# Altium footprint library UltraZOhm_CarrierBoard.PcbLib: 71 footprints (part 3 of 5)
Each footprint in its own frame and in the unit in brackets; x right, y up, seen from the top. Pads: shape width x height; smd on the part's side, far side on the other; paste and mask are expansions set on the pad; w line width, h text height; cw(c..) or ccw(c..) is an arc to the next point about the centre after c.
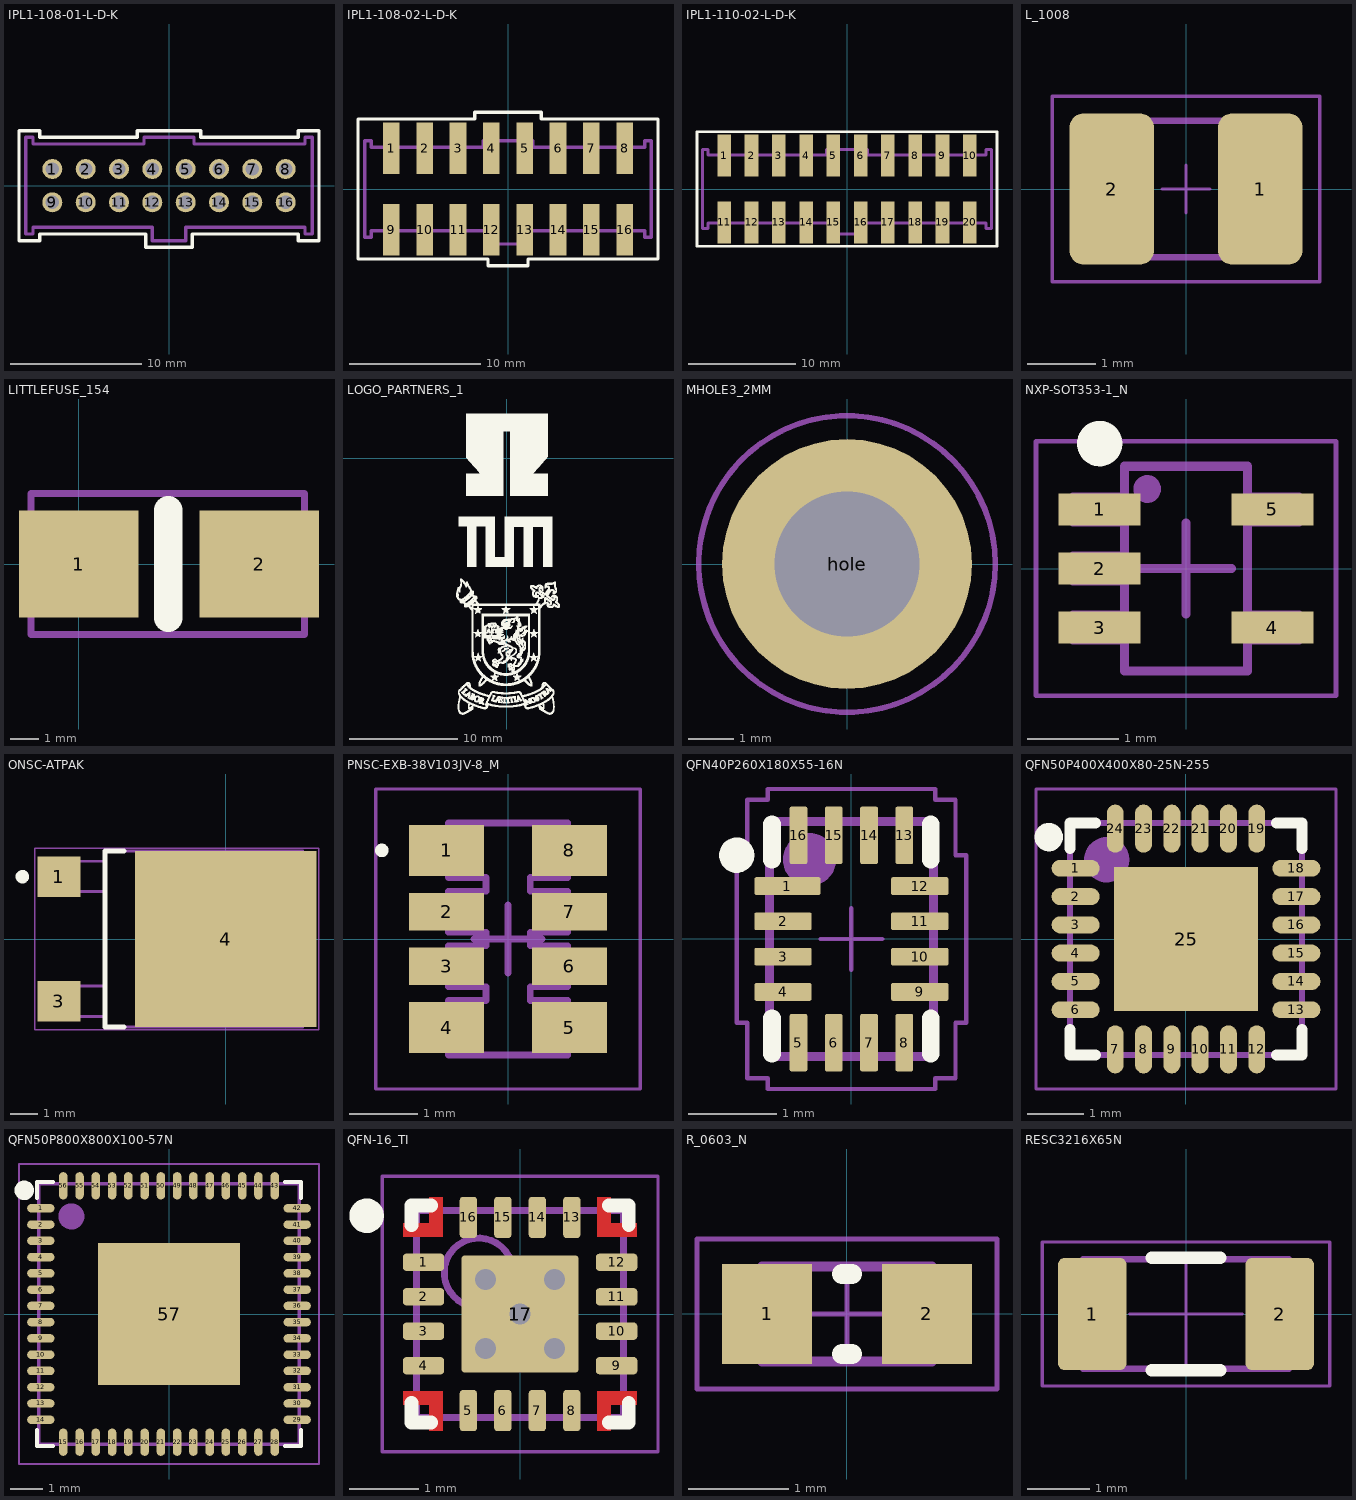
[diagram p2: the footprints below, top view; thin cyan lines are the x and y axes]

## IPL1-108-01-L-D-K [mil]
pads (16):
  round 60 hole 40 mask+3: 1(-350,50) 2(-250,50) 3(-150,50) 4(-50,50) 5(50,50) 6(150,50) 7(250,50) 8(350,50) 9(-350,-50) 10(-250,-50) 11(-150,-50) 12(-50,-50) 13(50,-50) 14(150,-50) 15(250,-50) 16(350,-50)
Top Overlay:
  lines w10: -450,-165 -388,-165 -388,-145 -70,-145 -70,-185 70,-185 70,-145 388,-145 388,-165 450,-165 450,165 388,165 388,145 95,145 95,165 -95,165 -95,145 -388,145 -388,165 -450,165 -450,-165
Mechanical 5:
  lines w10: -430,-145 -408,-145 -408,-125 -50,-125 -50,-165 50,-165 50,-125 408,-125 408,-145 430,-145 430,145 408,145 408,125 75,125 75,145 -75,145 -75,125 -408,125 -408,145 -430,145 -430,-145
  text ".Designator" at -29.95,74.14 h60
3D body "IPL1-108-01-L-D-K.stp": height 320, standoff -120, extent -430,-165 430,145

## IPL1-108-02-L-D-K [mil]
pads (16):
  rect 50x155 smd mask+2: 1(-350,122.5) 2(-250,122.5) 3(-150,122.5) 4(-50,122.5) 5(50,122.5) 6(150,122.5) 7(250,122.5) 8(350,122.5) 9(-350,-122.5) 10(-250,-122.5) 11(-150,-122.5) 12(-50,-122.5) 13(50,-122.5) 14(150,-122.5) 15(250,-122.5) 16(350,-122.5)
Top Overlay:
  lines w10: -450,-210 -60,-210 -60,-230 60,-230 60,-210 450,-210 450,210 100,210 100,230 -100,230 -100,210 -450,210 -450,-210
Mechanical 5:
  lines w10: -430,-145 -430,145 -410,145 -410,125 -75,125 -75,145 75,145 75,125 410,125 410,145 430,145 430,-145 410,-145 410,-125 50,-125 50,-165 -50,-165 -50,-125 -410,-125 -410,-145 -430,-145
  text ".Designator" at -33.94,63.07 h60
3D body "IPL1-108-02-L-D-K.stp": height 320, standoff -25, extent -430,-188.5 430,188.5

## IPL1-110-02-L-D-K [mil]
pads (20):
  rect 50x155 smd mask+2: 1(-450,122.5) 2(-350,122.5) 3(-250,122.5) 4(-150,122.5) 5(-50,122.5) 6(50,122.5) 7(150,122.5) 8(250,122.5) 9(350,122.5) 10(450,122.5) 11(-450,-122.5) 12(-350,-122.5) 13(-250,-122.5) 14(-150,-122.5) 15(-50,-122.5) 16(50,-122.5) 17(150,-122.5) 18(250,-122.5) 19(350,-122.5) 20(450,-122.5)
Top Overlay:
  lines w10: -550,-210 550,-210 550,210 -550,210 -550,-210
Mechanical 5:
  lines w10: -530,-145 -510,-145 -510,-125 -50,-125 -50,-165 50,-165 50,-125 510,-125 510,-145 530,-145 530,145 510,145 510,125 75,125 75,145 -75,145 -75,125 -510,125 -510,145 -530,145 -530,-145
  text ".Designator" at -59.06,-43.31 h60
3D body "IPL1-110-02-F-D-K.stp": height 345, standoff 0, extent -530,-188.5 530,188.5

## L_1008 [mm]
pads (2):
  rrect33% 1.24x2.22 smd: 1(1.09,0) 2(-1.09,0)
Mechanical 5:
  lines w0.1: -0.65,-1 -0.65,1 ; 0.65,-1 0.65,1 ; -1.25,-1 1.25,-1 1.25,1 -1.25,1 -1.25,-1
  text ".Designator" at 1.524,0.554 h0.76
Mechanical 15:
  lines w0.05: -0.35,0 0.35,0 ; 0,-0.35 0,0.35 ; -1.96,-1.36 1.96,-1.36 1.96,1.36 -1.96,1.36 -1.96,-1.36
3D body "LQM2HP_G0.stp": height 0.9, standoff 0, extent -1.25,-1 1.25,1

## LITTLEFUSE_154 [mm]
pads (2):
  rect 4.24x3.81 smd: 1(0,0) 2(6.4,0)
Top Overlay:
  lines w1: 3.175,-1.905 3.175,1.905
Mechanical 5:
  lines w0.254: -1.7,-2.5 8,-2.5 8,2.5 -1.7,2.5 -1.7,-2.5
  text ".Designator" at 4.116,0.832 h1.52
3D body "User Library-Littlefuse 0154 Holder and Fuse.STEP": height 3.71, standoff 0.01, extent -1.658,-2.488 8.042,2.512

## LOGO_PARTNERS_1 [mm]
Top Overlay:
  drawing of 11309 lines, arcs and shapes, not listed

## MHOLE3_2MM [mm]
pads (1):
  round 5.5 hole 3.2: hole(0,0)
Mechanical 5:
  circle w0.1: c0,0 r1.6
  circle w0.1: c0,0 r3.25
  text ".Designator" at -7.3,2.2 h1.52
Mechanical 14:
  circle w0.1: c0,0 r3.25
  circle w0.1: c0,0 r1.6
Mechanical 15:
  circle w0.05: c0,0 r3.3
  lines w0.05: -1,0 1,0 ; 0,-1 0,1
Mechanical 16:
  circle w0.05: c0,0 r3.3
3D body "SW3dPS-DIN 967.STEP": height 2.33, standoff -4, extent -3.75,-3.75 3.75,3.75

## NXP-SOT353-1_N [mm]
pads (5):
  rect 0.9x0.35 smd: 1(-0.95,0.65) 2(-0.95,0) 3(-0.95,-0.65) 4(0.95,-0.65) 5(0.95,0.65)
Top Overlay:
  circle w0.25: c-0.95,1.375 r0.125
Mechanical 5:
  circle w0.152: c-0.426,0.875 r0.076
  lines w0.05: -0.675,-0.813 -1.25,-0.813 -1.25,-0.488 -0.675,-0.488 ; -0.675,-0.163 -1.25,-0.163 -1.25,0.162 -0.675,0.162 ; -0.675,0.487 -1.25,0.487 -1.25,0.813 -0.675,0.813 ; 0.675,-0.813 1.25,-0.813 1.25,-0.487 0.675,-0.487 ; 0.675,0.488 1.25,0.488 1.25,0.813 0.675,0.813
  lines w0.1: -0.675,-1.125 0.675,-1.125 0.675,1.125 -0.675,1.125 -0.675,-1.125
  text ".Designator" at 0.273,1.317 h0.76
Mechanical 15:
  lines w0.05: -1.65,-1.4 1.65,-1.4 1.65,1.4 -1.65,1.4 -1.65,-1.4
  lines w0.1: -0.5,0 0.5,0 ; 0,-0.5 0,0.5
3D body: height 1.1, standoff 0, extent -0.675,-1.125 0.675,1.125

## ONSC-ATPAK [mm]
pads (3):
  rect 1.6x1.5 smd: 1(-6.15,2.3) 3(-6.15,-2.3)
  rect 6.7x6.5 smd: 4(0,0)
Top Overlay:
  circle w0.25: c-7.5,2.3 r0.125
  lines w0.2: -3.75,-3.25 -4.45,-3.25 -4.45,3.25 -3.75,3.25
Mechanical 5:
  lines w0.1: -4.5,-2.863 -6.45,-2.863 -6.45,-1.737 -4.475,-1.737 ; -4.475,1.75 -6.425,1.75 -6.425,2.875 -4.45,2.875 ; -4.45,-3.25 2.85,-3.25 2.85,3.25 -4.45,3.25 -4.45,-3.25
  text ".Designator" at -2.4,-0.7 h1.52
Mechanical 15:
  lines w0.05: -7.05,-3.35 -7.05,3.35 ; -7.05,-3.35 3.45,-3.35 ; -7.05,-3.35 -7.05,3.35 ; -7.05,-3.35 3.45,-3.35 ; -7.05,3.35 3.45,3.35 ; -7.05,3.35 3.45,3.35 ; 3.45,-3.35 3.45,3.35 ; 3.45,-3.35 3.45,3.35
  lines w0.1: -0.5,0 0.5,0 ; 0,-0.5 0,0.5
3D body: height 1.77, standoff 0.02, extent -4.45,-3.25 2.85,3.25

## PNSC-EXB-38V103JV-8_M [mm]
pads (8):
  rect 1.1x0.75 smd: 1(-0.9,1.3) 4(-0.9,-1.3) 5(0.9,-1.3) 8(0.9,1.3)
  rect 1.1x0.55 smd: 2(-0.9,0.4) 3(-0.9,-0.4) 6(0.9,-0.4) 7(0.9,0.4)
Top Overlay:
  circle w0.1: c-1.85,1.3 r0.05
Mechanical 5:
  lines w0.1: -0.875,-1.7 0.875,-1.7 0.875,-0.9 0.325,-0.9 0.325,-0.7 0.875,-0.7 0.875,-0.1 0.325,-0.1 0.325,0.1 0.875,0.1 0.875,0.7 0.325,0.7 0.325,0.9 0.875,0.9 0.875,1.7 -0.875,1.7 -0.875,0.9 -0.325,0.9 -0.325,0.7 -0.875,0.7 -0.875,0.1 -0.325,0.1 -0.325,-0.1 -0.875,-0.1 -0.875,-0.7 -0.325,-0.7 -0.325,-0.9 -0.875,-0.9 -0.875,-1.7
  text ".Designator" at 1.4,-2.004 h0.76
Mechanical 15:
  lines w0.05: -1.94,-2.2 -1.94,2.2 1.94,2.2 1.94,-2.2 -1.94,-2.2
  lines w0.1: -0.5,0 0.5,0 ; 0,-0.5 0,0.5
3D body: height 0.6, standoff 0, extent -0.875,-1.7 0.875,1.7

## QFN40P260X180X55-16N [mm]
pads (16):
  rrect20% 0.75x0.2 smd: 1(-0.725,0.6)
  rrect20% 0.65x0.2 smd: 2(-0.775,0.2) 3(-0.775,-0.2) 4(-0.775,-0.6) 9(0.775,-0.6) 10(0.775,-0.2) 11(0.775,0.2) 12(0.775,0.6)
  rrect20% 0.2x0.65 smd: 5(-0.6,-1.175) 6(-0.2,-1.175) 7(0.2,-1.175) 8(0.6,-1.175) 13(0.6,1.175) 14(0.2,1.175) 15(-0.2,1.175) 16(-0.6,1.175)
Top Overlay:
  circle w0.2: c-1.3,0.95 r0.1
  lines w0.2: -0.9,-1.3 -0.9,-0.9 ; -0.9,0.9 -0.9,1.3 ; 0.9,-1.3 0.9,-0.9 ; 0.9,0.9 0.9,1.3
Mechanical 5:
  circle w0.3: c-0.475,0.9 r0.15
  lines w0.1: -0.93,-1.33 0.93,-1.33 0.93,1.33 -0.93,1.33 -0.93,-1.33
  text ".Designator" at 0.655,-1.079 h0.76
Mechanical 12:
  lines w0.001: -0.9,-1.3 0.9,-1.3 0.9,1.3 -0.9,1.3 -0.9,-1.3
Mechanical 15:
  lines w0.05: -0.35,0 0.35,0 ; 0,-0.35 0,0.35 ; -1.3,-0.95 -1.18,-0.95 -1.18,-1.58 -0.95,-1.58 -0.95,-1.7 0.95,-1.7 0.95,-1.58 1.18,-1.58 1.18,-0.95 1.3,-0.95 1.3,0.95 1.18,0.95 1.18,1.58 0.95,1.58 0.95,1.7 -0.95,1.7 -0.95,1.58 -1.18,1.58 -1.18,0.95 -1.3,0.95 -1.3,-0.95
3D body: height 0.55, standoff 0.03, extent -0.93,-1.33 0.93,1.33
3D body: height 0.56, standoff 0, extent -0.798,0.601 -0.2,1.199

## QFN50P400X400X80-25N-255 [mm]
pads (25):
  oval 0.85x0.3 smd: 1(-1.95,1.25) 2(-1.95,0.75) 3(-1.95,0.25) 4(-1.95,-0.25) 5(-1.95,-0.75) 6(-1.95,-1.25) 13(1.95,-1.25) 14(1.95,-0.75) 15(1.95,-0.25) 16(1.95,0.25) 17(1.95,0.75) 18(1.95,1.25)
  oval 0.3x0.85 smd: 7(-1.25,-1.95) 8(-0.75,-1.95) 9(-0.25,-1.95) 10(0.25,-1.95) 11(0.75,-1.95) 12(1.25,-1.95) 19(1.25,1.95) 20(0.75,1.95) 21(0.25,1.95) 22(-0.25,1.95) 23(-0.75,1.95) 24(-1.25,1.95)
  rect 2.55x2.55 smd: 25(0,0)
Top Overlay:
  circle w0.25: c-2.425,1.8 r0.125
  lines w0.2: -2.05,-1.6 -2.05,-2.05 -1.6,-2.05 ; -2.05,1.6 -2.05,2.05 -1.6,2.05 ; 1.6,-2.05 2.05,-2.05 2.05,-1.6 ; 1.6,2.05 2.05,2.05 2.05,1.6
Mechanical 5:
  circle w0.4: c-1.4,1.4 r0.2
  lines w0.1: -2.05,-2.05 2.05,-2.05 2.05,2.05 -2.05,2.05 -2.05,-2.05
  text ".Designator" at 2.526,2.077 h1.52
Mechanical 15:
  lines w0.05: -0.5,0 0.5,0 ; 0,-0.5 0,0.5 ; -2.65,-2.65 2.65,-2.65 2.65,2.65 -2.65,2.65 -2.65,-2.65
3D body "User Library-QFN24-0_5.STEP": height 1, standoff 0, extent -2,-2 2,2

## QFN50P800X800X100-57N [mm]
pads (57):
  oval 0.84x0.26 smd: 1(-3.94,3.25) 2(-3.94,2.75) 3(-3.94,2.25) 4(-3.94,1.75) 5(-3.94,1.25) 6(-3.94,0.75) 7(-3.94,0.25) 8(-3.94,-0.25) 9(-3.94,-0.75) 10(-3.94,-1.25) 11(-3.94,-1.75) 12(-3.94,-2.25) 13(-3.94,-2.75) 14(-3.94,-3.25) 29(3.94,-3.25) 30(3.94,-2.75) 31(3.94,-2.25) 32(3.94,-1.75) 33(3.94,-1.25) 34(3.94,-0.75) 35(3.94,-0.25) 36(3.94,0.25) 37(3.94,0.75) 38(3.94,1.25) 39(3.94,1.75) 40(3.94,2.25) 41(3.94,2.75) 42(3.94,3.25)
  oval 0.26x0.84 smd: 15(-3.25,-3.94) 16(-2.75,-3.94) 17(-2.25,-3.94) 18(-1.75,-3.94) 19(-1.25,-3.94) 20(-0.75,-3.94) 21(-0.25,-3.94) 22(0.25,-3.94) 23(0.75,-3.94) 24(1.25,-3.94) 25(1.75,-3.94) 26(2.25,-3.94) 27(2.75,-3.94) 28(3.25,-3.94) 43(3.25,3.94) 44(2.75,3.94) 45(2.25,3.94) 46(1.75,3.94) 47(1.25,3.94) 48(0.75,3.94) 49(0.25,3.94) 50(-0.25,3.94) 51(-0.75,3.94) 52(-1.25,3.94) 53(-1.75,3.94) 54(-2.25,3.94) 55(-2.75,3.94) 56(-3.25,3.94)
  rect 4.37x4.37 smd: 57(0,0)
Top Overlay:
  circle w0.3: c-4.45,3.8 r0.15
  lines w0.12: -4.06,-3.56 -4.06,-4.06 -3.56,-4.06 ; -4.06,3.56 -4.06,4.06 -3.56,4.06 ; 3.56,-4.06 4.06,-4.06 4.06,-3.56 ; 3.56,4.06 4.06,4.06 4.06,3.56
Top Paste:
  region: 0.32,0.32 1.86,0.32 1.86,1.86 0.32,1.86
  region: -1.86,0.32 -0.32,0.32 -0.32,1.86 -1.86,1.86
  region: 0.32,-1.86 1.86,-1.86 1.86,-0.32 0.32,-0.32
  region: -1.86,-1.86 -0.32,-1.86 -0.32,-0.32 -1.86,-0.32
Mechanical 5:
  circle w0.4: c-3,3 r0.2
  lines w0.1: -4,-4 4,-4 4,4 -4,4 -4,-4
  text ".Designator" at -1.2,-0.825 h1.52
Mechanical 15:
  lines w0.05: -0.35,0 0.35,0 ; 0,-0.35 0,0.35 ; -4.61,-4.61 4.61,-4.61 4.61,4.61 -4.61,4.61 -4.61,-4.61
3D body "User Library-QFN56 (8x8).STEP": height 0.94, standoff -0.01, extent -4.015,-4.015 4.015,4.015

## QFN-16_TI [mm]
pads (18):
  rrect40% 0.6x0.25 smd: 1(-1.4,0.75) 2(-1.4,0.25) 3(-1.4,-0.25) 4(-1.4,-0.75) 9(1.4,-0.75) 10(1.4,-0.25) 11(1.4,0.25) 12(1.4,0.75)
  rrect40% 0.25x0.6 smd: 5(-0.75,-1.4) 6(-0.25,-1.4) 7(0.25,-1.4) 8(0.75,-1.4) 13(0.75,1.4) 14(0.25,1.4) 15(-0.25,1.4) 16(-0.75,1.4)
  rrect50% 1.55x1.55 on Top Paste: 17(0,0)
  rrect6% 1.7x1.7 smd paste-0.85: 17(0,0)
via 0,0 diameter 0.5 hole 0.3
via 0.5,-0.5 diameter 0.5 hole 0.3
via 0.5,0.5 diameter 0.5 hole 0.3
via -0.5,0.5 diameter 0.5 hole 0.3
via -0.5,-0.5 diameter 0.5 hole 0.3
Top Layer:
  region: -1.118,1.118 -1.118,1.693 -1.318,1.693 -1.318,1.318 -1.693,1.318 -1.693,1.118
  region: -1.118,-1.118 -1.693,-1.118 -1.693,-1.318 -1.318,-1.318 -1.318,-1.694 -1.118,-1.694
  region: 1.118,-1.118 1.693,-1.118 1.693,-1.318 1.318,-1.318 1.318,-1.694 1.118,-1.694
  region: 1.118,1.118 1.118,1.693 1.318,1.693 1.318,1.318 1.693,1.318 1.693,1.118
Top Overlay:
  circle w0.25: c-2.225,1.425 r0.125
  lines w0.2: -1.575,-1.29 -1.575,-1.575 -1.29,-1.575 ; -1.575,1.29 -1.575,1.575 -1.29,1.575 ; 1.29,-1.575 1.575,-1.575 1.575,-1.29 ; 1.29,1.575 1.575,1.575 1.575,1.29
Mechanical 5:
  circle w0.1: c-0.6,0.6 r0.5
  lines w0.1: -1.5,-1.5 1.5,-1.5 1.5,1.5 -1.5,1.5 -1.5,-1.5
  text ".Designator" at 1.059,-1.03 h0.76
Mechanical 15:
  lines w0.05: -2,-2 2,-2 2,2 -2,2 -2,-2
  lines w0.1: -0.5,0 0.5,0 ; 0,-0.5 0,0.5
3D body: height 1, standoff 0, extent -1.5,-1.5 1.5,1.5

## R_0603_N [mm]
pads (2):
  rect 0.9x1 smd: 1(-0.8,0) 2(0.8,0)
Top Overlay:
  lines w0.2: -0.05,-0.4 0.05,-0.4 ; -0.05,0.4 0.05,0.4
Mechanical 5:
  lines w0.1: -0.85,-0.475 0.85,-0.475 0.85,0.475 -0.85,0.475 -0.85,-0.475
  text ".Designator" at -1.3,0.375 h0.76
Mechanical 15:
  lines w0.05: -0.475,0 0.475,0 ; 0,-0.475 0,0.475 ; -1.5,-0.75 1.5,-0.75 1.5,0.75 -1.5,0.75 -1.5,-0.75
3D body: height 0.6, standoff 0, extent -0.849,-0.474 -0.58,0.475
3D body: height 0.6, standoff 0, extent -0.58,-0.474 0.581,0.475
3D body: height 0.6, standoff 0, extent 0.581,-0.474 0.85,0.475

## RESC3216X65N [mm]
pads (2):
  rrect20% 1.1x1.8 smd: 1(-1.5,0) 2(1.5,0)
Top Overlay:
  lines w0.2: -0.55,-0.9 0.55,-0.9 ; -0.55,0.9 0.55,0.9
Mechanical 5:
  lines w0.1: -1.1,-0.875 -1.1,0.875 ; 1.1,-0.875 1.1,0.875 ; -1.65,-0.875 -1.65,0.875 1.65,0.875 1.65,-0.875 0,-0.875 -1.65,-0.875
  text ".Designator" at -1.6,1.2 h0.76
Mechanical 15:
  lines w0.05: -0.9,0 0,0 ; 0,-0.9 0,0 ; 0,0.9 0,0 ; 0.9,0 0,0 ; -2.3,-1.15 -2.3,1.15 2.3,1.15 2.3,-1.15 0,-1.15 -2.3,-1.15
3D body "RESC3216X06N.STEP": height 0.55, standoff 0, extent -1.6,-0.8 1.6,0.8